# Altium schematic symbol library Capacitor - Aluminium TH.SchLib: 4591 symbols (part 13 of 27) (continued)
## ESK108M025AH4AA (continued)
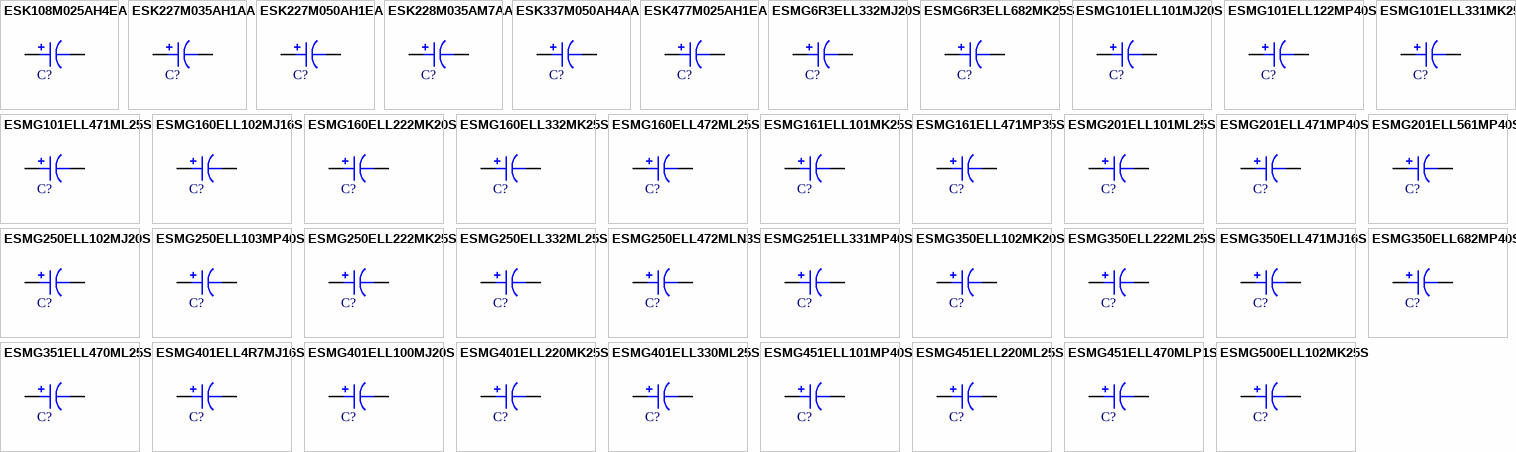
[diagram p54: symbols ESK108M025AH4EA to ESMG500ELL102MK25S]

## ESK108M025AH4EA
designator C?, comment 1000uF  (value not drawn)
CAP ALUM 1000UF 20% 25V RADIAL; Part Number: ESK108M025AH4EA; Manufacturer: KEMET; TemperatureRange: -40C ~ 85C; Type: Polar; Ripple Current: 760mA @ 120Hz; Value: 1000uF; PartId: 25450; Supplier 1: Digi-Key; Supplier Part Number 1: 399-6652-3-ND; ComponentLink1Description: Datasheet; ComponentLink1URL: http://www.kemet.com/docfinder?Partnumber=ESK108M025AH4EA; ComponentLink2Description: Digi-Key Listing; ComponentLink2URL: https://www.digikey.com/product-detail/en/kemet/ESK108M025AH4EA/399-6652-3-ND/3083067; Tolerance: 20%; Voltage: 25V; Price: 0.1466; Device Package: Radial, Can, 10mm
footprint CAP AL TH D10 L5 H22
pins: 1, 2

## ESK227M035AH1AA
designator C?, comment 220uF  (value not drawn)
CAP ALUM 220UF 20% 35V RADIAL; Part Number: ESK227M035AH1AA; Manufacturer: KEMET; TemperatureRange: -40C ~ 85C; Type: Polar; Ripple Current: 370mA @ 120Hz; Value: 220uF; PartId: 24678; Supplier 1: Digi-Key; Supplier Part Number 1: 399-6109-ND; ComponentLink1Description: Datasheet; ComponentLink1URL: http://capacitoredge.kemet.com/capedge2/DataSheet?pn=ESK227M035AH1AA; ComponentLink2Description: Digi-Key Listing; ComponentLink2URL: https://www.digikey.com/product-detail/en/kemet/ESK227M035AH1AA/399-6109-ND/2712538; Tolerance: 20%; Voltage: 35V; Price: 0.32; Device Package: Radial, Can, 10mm
footprint CAP AL TH D10 L5 H14.5
pins: 1, 2

## ESK227M050AH1EA
designator C?, comment 220uF  (value not drawn)
CAP ALUM 220UF 20% 50V RADIAL; Part Number: ESK227M050AH1EA; Manufacturer: KEMET; TemperatureRange: -40C ~ 85C; Type: Polar; Ripple Current: 360mA @ 120Hz; Value: 220uF; PartId: 24514; Supplier 1: Digi-Key; Supplier Part Number 1: 399-6654-3-ND; ComponentLink1Description: Datasheet; ComponentLink1URL: http://www.kemet.com/docfinder?Partnumber=ESK227M050AH1EA; ComponentLink2Description: Digi-Key Listing; ComponentLink2URL: https://www.digikey.com/product-detail/en/kemet/ESK227M050AH1EA/399-6654-3-ND/3083069; Tolerance: 20%; Voltage: 50V; Price: 0.1275; Device Package: Radial, Can, 10mm
footprint CAP AL TH D10 L5 H14.5
pins: 1, 2

## ESK228M035AM7AA
designator C?, comment 2200uF  (value not drawn)
CAP ALUM 2200UF 20% 35V RADIAL; Part Number: ESK228M035AM7AA; Manufacturer: KEMET; TemperatureRange: -40C ~ 85C; Type: Polar; Ripple Current: 1.6A @ 120Hz; Value: 2200uF; PartId: 26838; Supplier 1: Digi-Key; Supplier Part Number 1: 399-6111-ND; ComponentLink1Description: Datasheet; ComponentLink1URL: http://capacitoredge.kemet.com/capedge2/DataSheet?pn=ESK228M035AM7AA; ComponentLink2Description: Digi-Key Listing; ComponentLink2URL: https://www.digikey.com/product-detail/en/kemet/ESK228M035AM7AA/399-6111-ND/2712541; Tolerance: 20%; Voltage: 35V; Price: 0.99; Device Package: Radial, Can, 16mm
footprint CAP AL TH D16 L7.5 H27
pins: 1, 2

## ESK337M050AH4AA
designator C?, comment 330uF  (value not drawn)
CAP ALUM 330UF 20% 50V RADIAL; Part Number: ESK337M050AH4AA; Manufacturer: KEMET; TemperatureRange: -40C ~ 85C; Type: Polar; Ripple Current: 580mA @ 120Hz; Value: 330uF; PartId: 25498; Supplier 1: Digi-Key; Supplier Part Number 1: 399-6608-ND; ComponentLink1Description: Datasheet; ComponentLink1URL: http://www.kemet.com/docfinder?Partnumber=ESK337M050AH4AA; ComponentLink2Description: Digi-Key Listing; ComponentLink2URL: https://www.digikey.com/product-detail/en/kemet/ESK337M050AH4AA/399-6608-ND/3083023; Tolerance: 20%; Voltage: 50V; Price: 0.46; Device Package: Radial, Can, 10mm
footprint CAP AL TH D10 L5 H22
pins: 1, 2

## ESK477M025AH1EA
designator C?, comment 470uF  (value not drawn)
CAP ALUM 470UF 20% 25V RADIAL; Part Number: ESK477M025AH1EA; Manufacturer: KEMET; TemperatureRange: -40C ~ 85C; Type: Polar; Ripple Current: 460mA @ 120Hz; Value: 470uF; PartId: 24495; Supplier 1: Digi-Key; Supplier Part Number 1: 399-6656-3-ND; ComponentLink1Description: Datasheet; ComponentLink1URL: http://www.kemet.com/docfinder?Partnumber=ESK477M025AH1EA; ComponentLink2Description: Digi-Key Listing; ComponentLink2URL: https://www.digikey.com/product-detail/en/kemet/ESK477M025AH1EA/399-6656-3-ND/3083071; Tolerance: 20%; Voltage: 25V; Price: 0.1068; Device Package: Radial, Can, 10mm
footprint CAP AL TH D10 L5 H14.5
pins: 1, 2

## ESMG6R3ELL332MJ20S
designator C?, comment 3300uF  (value not drawn)
CAP ALUM 3300UF 20% 6.3V RADIAL; Part Number: ESMG6R3ELL332MJ20S; Manufacturer: United Chemi-Con; TemperatureRange: -40C ~ 85C; Type: Polar; Ripple Current: 1.185A @ 120Hz; Value: 3300uF; PartId: 25639; Supplier 1: Digi-Key; Supplier Part Number 1: 565-1007-ND; ComponentLink1Description: Datasheet; ComponentLink1URL: http://www.chemi-con.com/upload/files/6/3/873997624d9b1bc8060f8.pdf; ComponentLink2Description: Digi-Key Listing; ComponentLink2URL: https://www.digikey.com/product-detail/en/united-chemi-con/ESMG6R3ELL332MJ20S/565-1007-ND/755523; Tolerance: 20%; Voltage: 6.3V; Price: 0.73; Device Package: Radial, Can, 10mm
footprint CAP AL TH D10 L5 H22
pins: 1, 2

## ESMG6R3ELL682MK25S
designator C?, comment 6800uF  (value not drawn)
CAP ALUM 6800UF 20% 6.3V RADIAL; Part Number: ESMG6R3ELL682MK25S; Manufacturer: United Chemi-Con; TemperatureRange: -40C ~ 85C; Type: Polar; Ripple Current: 1.915A @ 120Hz; Value: 6800uF; PartId: 23709; Supplier 1: Digi-Key; Supplier Part Number 1: 565-1009-ND; ComponentLink1Description: Datasheet; ComponentLink1URL: http://www.chemi-con.com/upload/files/6/3/873997624d9b1bc8060f8.pdf; ComponentLink2Description: Digi-Key Listing; ComponentLink2URL: https://www.digikey.com/product-detail/en/united-chemi-con/ESMG6R3ELL682MK25S/565-1009-ND/755525; Tolerance: 20%; Voltage: 6.3V; Price: 1.16; Device Package: Radial, Can, 12.5mm
footprint CAP AL TH D12.5 L5 H26.5
pins: 1, 2

## ESMG101ELL101MJ20S
designator C?, comment 100uF  (value not drawn)
CAP ALUM 100UF 20% 100V RADIAL; Part Number: ESMG101ELL101MJ20S; Manufacturer: United Chemi-Con; TemperatureRange: -40C ~ 85C; Type: Polar; Ripple Current: 370mA @ 120Hz; Value: 100uF; PartId: 25629; Supplier 1: Digi-Key; Supplier Part Number 1: 565-1152-ND; ComponentLink1Description: Datasheet; ComponentLink1URL: http://www.chemi-con.com/upload/files/6/3/873997624d9b1bc8060f8.pdf; ComponentLink2Description: Digi-Key Listing; ComponentLink2URL: https://www.digikey.com/product-detail/en/united-chemi-con/ESMG101ELL101MJ20S/565-1152-ND/755668; Tolerance: 20%; Voltage: 100V; Price: 0.72; Device Package: Radial, Can, 10mm
footprint CAP AL TH D10 L5 H22
pins: 1, 2

## ESMG101ELL122MP40S
designator C?, comment 1200uF  (value not drawn)
CAP ALUM 1200UF 20% 100V RADIAL; Part Number: ESMG101ELL122MP40S; Manufacturer: United Chemi-Con; TemperatureRange: -40C ~ 85C; Type: Polar; Ripple Current: 1.98A @ 120Hz; Value: 1200uF; PartId: 27592; Supplier 1: Digi-Key; Supplier Part Number 1: 565-1161-ND; ComponentLink1Description: Datasheet; ComponentLink1URL: http://www.chemi-con.com/upload/files/6/3/873997624d9b1bc8060f8.pdf; ComponentLink2Description: Digi-Key Listing; ComponentLink2URL: https://www.digikey.com/product-detail/en/united-chemi-con/ESMG101ELL122MP40S/565-1161-ND/755677; Tolerance: 20%; Voltage: 100V; Price: 4.53; Device Package: Radial, Can, 22mm
footprint CAP AL TH D22 L10 H43
pins: 1, 2

## ESMG101ELL331MK25S
designator C?, comment 330uF  (value not drawn)
CAP ALUM 330UF 20% 100V RADIAL; Part Number: ESMG101ELL331MK25S; Manufacturer: United Chemi-Con; TemperatureRange: -40C ~ 85C; Type: Polar; Ripple Current: 760mA @ 120Hz; Value: 330uF; PartId: 23721; Supplier 1: Digi-Key; Supplier Part Number 1: 565-1154-ND; ComponentLink1Description: Datasheet; ComponentLink1URL: http://www.chemi-con.com/upload/files/6/3/873997624d9b1bc8060f8.pdf; ComponentLink2Description: Digi-Key Listing; ComponentLink2URL: https://www.digikey.com/product-detail/en/united-chemi-con/ESMG101ELL331MK25S/565-1154-ND/755670; Tolerance: 20%; Voltage: 100V; Price: 1.3; Device Package: Radial, Can, 12.5mm
footprint CAP AL TH D12.5 L5 H26.5
pins: 1, 2

## ESMG101ELL471ML25S
designator C?, comment 470uF  (value not drawn)
CAP ALUM 470UF 20% 100V RADIAL; Part Number: ESMG101ELL471ML25S; Manufacturer: United Chemi-Con; TemperatureRange: -40C ~ 85C; Type: Polar; Ripple Current: 1A @ 120Hz; Value: 470uF; PartId: 26691; Supplier 1: Digi-Key; Supplier Part Number 1: 565-1156-ND; ComponentLink1Description: Datasheet; ComponentLink1URL: http://www.chemi-con.com/upload/files/6/3/873997624d9b1bc8060f8.pdf; ComponentLink2Description: Digi-Key Listing; ComponentLink2URL: https://www.digikey.com/product-detail/en/united-chemi-con/ESMG101ELL471ML25S/565-1156-ND/755672; Tolerance: 20%; Voltage: 100V; Price: 1.84; Device Package: Radial, Can, 16mm
footprint CAP AL TH D16 L7.5 H26.5
pins: 1, 2

## ESMG160ELL102MJ16S
designator C?, comment 1000uF  (value not drawn)
CAP ALUM 1000UF 20% 16V RADIAL; Part Number: ESMG160ELL102MJ16S; Manufacturer: United Chemi-Con; TemperatureRange: -40C ~ 85C; Type: Polar; Ripple Current: 785mA @ 120Hz; Value: 1000uF; PartId: 25303; Supplier 1: Digi-Key; Supplier Part Number 1: 565-1041-ND; ComponentLink1Description: Datasheet; ComponentLink1URL: http://www.chemi-con.com/upload/files/6/3/873997624d9b1bc8060f8.pdf; ComponentLink2Description: Digi-Key Listing; ComponentLink2URL: https://www.digikey.com/product-detail/en/united-chemi-con/ESMG160ELL102MJ16S/565-1041-ND/755557; Tolerance: 20%; Voltage: 16V; Price: 0.64; Device Package: Radial, Can, 10mm
footprint CAP AL TH D10 L5 H17.5
pins: 1, 2

## ESMG160ELL222MK20S
designator C?, comment 2200uF  (value not drawn)
CAP ALUM 2200UF 20% 16V RADIAL; Part Number: ESMG160ELL222MK20S; Manufacturer: United Chemi-Con; TemperatureRange: -40C ~ 85C; Type: Polar; Ripple Current: 1.295A @ 120Hz; Value: 2200uF; PartId: 23019; Supplier 1: Digi-Key; Supplier Part Number 1: 565-1042-ND; ComponentLink1Description: Datasheet; ComponentLink1URL: http://www.chemi-con.com/upload/files/6/3/873997624d9b1bc8060f8.pdf; ComponentLink2Description: Digi-Key Listing; ComponentLink2URL: https://www.digikey.com/product-detail/en/united-chemi-con/ESMG160ELL222MK20S/565-1042-ND/755558; Tolerance: 20%; Voltage: 16V; Price: 0; Device Package: Radial, Can, 12.5mm
footprint CAP AL TH D12.5 L5 H21.5
pins: 1, 2

## ESMG160ELL332MK25S
designator C?, comment 3300uF  (value not drawn)
CAP ALUM 3300UF 20% 16V RADIAL; Part Number: ESMG160ELL332MK25S; Manufacturer: United Chemi-Con; TemperatureRange: -40C ~ 85C; Type: Polar; Ripple Current: 1.655A @ 120Hz; Value: 3300uF; PartId: 23705; Supplier 1: Digi-Key; Supplier Part Number 1: 565-1043-ND; ComponentLink1Description: Datasheet; ComponentLink1URL: http://www.chemi-con.com/upload/files/6/3/873997624d9b1bc8060f8.pdf; ComponentLink2Description: Digi-Key Listing; ComponentLink2URL: https://www.digikey.com/product-detail/en/united-chemi-con/ESMG160ELL332MK25S/565-1043-ND/755559; Tolerance: 20%; Voltage: 16V; Price: 1.14; Device Package: Radial, Can, 12.5mm
footprint CAP AL TH D12.5 L5 H26.5
pins: 1, 2

## ESMG160ELL472ML25S
designator C?, comment 4700uF  (value not drawn)
CAP ALUM 4700UF 20% 16V RADIAL; Part Number: ESMG160ELL472ML25S; Manufacturer: United Chemi-Con; TemperatureRange: -40C ~ 85C; Type: Polar; Ripple Current: 2.09A @ 120Hz; Value: 4700uF; PartId: 26664; Supplier 1: Digi-Key; Supplier Part Number 1: 565-1044-ND; ComponentLink1Description: Datasheet; ComponentLink1URL: http://www.chemi-con.com/upload/files/6/3/873997624d9b1bc8060f8.pdf; ComponentLink2Description: Digi-Key Listing; ComponentLink2URL: https://www.digikey.com/product-detail/en/united-chemi-con/ESMG160ELL472ML25S/565-1044-ND/755560; Tolerance: 20%; Voltage: 16V; Price: 1.63; Device Package: Radial, Can, 16mm
footprint CAP AL TH D16 L7.5 H26.5
pins: 1, 2

## ESMG161ELL101MK25S
designator C?, comment 100uF  (value not drawn)
CAP ALUM 100UF 20% 160V RADIAL; Part Number: ESMG161ELL101MK25S; Manufacturer: United Chemi-Con; TemperatureRange: -40C ~ 85C; Type: Polar; Ripple Current: 430mA @ 120Hz; Value: 100uF; PartId: 23738; Supplier 1: Digi-Key; Supplier Part Number 1: 565-1169-ND; ComponentLink1Description: Datasheet; ComponentLink1URL: http://www.chemi-con.com/upload/files/6/3/873997624d9b1bc8060f8.pdf; ComponentLink2Description: Digi-Key Listing; ComponentLink2URL: https://www.digikey.com/product-detail/en/united-chemi-con/ESMG161ELL101MK25S/565-1169-ND/755685; Tolerance: 20%; Voltage: 160V; Price: 1.54; Device Package: Radial, Can, 12.5mm
footprint CAP AL TH D12.5 L5 H26.5
pins: 1, 2

## ESMG161ELL471MP35S
designator C?, comment 470uF  (value not drawn)
CAP ALUM 470UF 20% 160V RADIAL; Part Number: ESMG161ELL471MP35S; Manufacturer: United Chemi-Con; TemperatureRange: -40C ~ 85C; Type: Polar; Ripple Current: 1.34A @ 120Hz; Value: 470uF; PartId: 27604; Supplier 1: Digi-Key; Supplier Part Number 1: 565-1176-ND; ComponentLink1Description: Datasheet; ComponentLink1URL: http://www.chemi-con.com/upload/files/6/3/873997624d9b1bc8060f8.pdf; ComponentLink2Description: Digi-Key Listing; ComponentLink2URL: https://www.digikey.com/product-detail/en/united-chemi-con/ESMG161ELL471MP35S/565-1176-ND/755692; Tolerance: 20%; Voltage: 160V; Price: 4.85; Device Package: Radial, Can, 22mm
footprint CAP AL TH D22 L10 H43
pins: 1, 2

## ESMG201ELL101ML25S
designator C?, comment 100uF  (value not drawn)
CAP ALUM 100UF 20% 200V RADIAL; Part Number: ESMG201ELL101ML25S; Manufacturer: United Chemi-Con; TemperatureRange: -40C ~ 85C; Type: Polar; Ripple Current: 475mA @ 120Hz; Value: 100uF; PartId: 26702; Supplier 1: Digi-Key; Supplier Part Number 1: 565-1185-ND; ComponentLink1Description: Datasheet; ComponentLink1URL: http://www.chemi-con.com/upload/files/6/3/873997624d9b1bc8060f8.pdf; ComponentLink2Description: Digi-Key Listing; ComponentLink2URL: https://www.digikey.com/product-detail/en/united-chemi-con/ESMG201ELL101ML25S/565-1185-ND/755701; Tolerance: 20%; Voltage: 200V; Price: 2.01; Device Package: Radial, Can, 16mm
footprint CAP AL TH D16 L7.5 H26.5
pins: 1, 2

## ESMG201ELL471MP40S
designator C?, comment 470uF  (value not drawn)
CAP ALUM 470UF 20% 200V RADIAL; Part Number: ESMG201ELL471MP40S; Manufacturer: United Chemi-Con; TemperatureRange: -40C ~ 85C; Type: Polar; Ripple Current: 1.35A @ 120Hz; Value: 470uF; PartId: 27585; Supplier 1: Digi-Key; Supplier Part Number 1: 565-1195-ND; ComponentLink1Description: Datasheet; ComponentLink1URL: http://www.chemi-con.com/upload/files/6/3/873997624d9b1bc8060f8.pdf; ComponentLink2Description: Digi-Key Listing; ComponentLink2URL: https://www.digikey.com/product-detail/en/united-chemi-con/ESMG201ELL471MP40S/565-1195-ND/755711; Tolerance: 20%; Voltage: 200V; Price: 4.93; Device Package: Radial, Can, 22mm
footprint CAP AL TH D22 L10 H43
pins: 1, 2

## ESMG201ELL561MP40S
designator C?, comment 560uF  (value not drawn)
CAP ALUM 560UF 20% 200V RADIAL; Part Number: ESMG201ELL561MP40S; Manufacturer: United Chemi-Con; TemperatureRange: -40C ~ 85C; Type: Polar; Ripple Current: 1.43A @ 120Hz; Value: 560uF; PartId: 27586; Supplier 1: Digi-Key; Supplier Part Number 1: 565-1196-ND; ComponentLink1Description: Datasheet; ComponentLink1URL: http://www.chemi-con.com/upload/files/6/3/873997624d9b1bc8060f8.pdf; ComponentLink2Description: Digi-Key Listing; ComponentLink2URL: https://www.digikey.com/product-detail/en/united-chemi-con/ESMG201ELL561MP40S/565-1196-ND/755712; Tolerance: 20%; Voltage: 200V; Price: 5.45; Device Package: Radial, Can, 22mm
footprint CAP AL TH D22 L10 H43
pins: 1, 2

## ESMG250ELL102MJ20S
designator C?, comment 1000uF  (value not drawn)
CAP ALUM 1000UF 20% 25V RADIAL; Part Number: ESMG250ELL102MJ20S; Manufacturer: United Chemi-Con; TemperatureRange: -40C ~ 85C; Type: Polar; Ripple Current: 955mA @ 120Hz; Value: 1000uF; PartId: 25638; Supplier 1: Digi-Key; Supplier Part Number 1: 565-1063-ND; ComponentLink1Description: Datasheet; ComponentLink1URL: http://www.chemi-con.com/upload/files/6/3/873997624d9b1bc8060f8.pdf; ComponentLink2Description: Digi-Key Listing; ComponentLink2URL: https://www.digikey.com/product-detail/en/united-chemi-con/ESMG250ELL102MJ20S/565-1063-ND/755579; Tolerance: 20%; Voltage: 25V; Price: 0.73; Device Package: Radial, Can, 10mm
footprint CAP AL TH D10 L5 H22
pins: 1, 2

## ESMG250ELL103MP40S
designator C?, comment 10000uF  (value not drawn)
CAP ALUM 10000UF 20% 25V RADIAL; Part Number: ESMG250ELL103MP40S; Manufacturer: United Chemi-Con; TemperatureRange: -40C ~ 85C; Type: Polar; Ripple Current: 3.24A @ 120Hz; Value: 10000uF; PartId: 27579; Supplier 1: Digi-Key; Supplier Part Number 1: 565-1074-ND; ComponentLink1Description: Datasheet; ComponentLink1URL: http://www.chemi-con.com/upload/files/6/3/873997624d9b1bc8060f8.pdf; ComponentLink2Description: Digi-Key Listing; ComponentLink2URL: https://www.digikey.com/product-detail/en/united-chemi-con/ESMG250ELL103MP40S/565-1074-ND/755590; Tolerance: 20%; Voltage: 25V; Price: 4.53; Device Package: Radial, Can, 22mm
footprint CAP AL TH D22 L10 H43
pins: 1, 2

## ESMG250ELL222MK25S
designator C?, comment 2200uF  (value not drawn)
CAP ALUM 2200UF 20% 25V RADIAL; Part Number: ESMG250ELL222MK25S; Manufacturer: United Chemi-Con; TemperatureRange: -40C ~ 85C; Type: Polar; Ripple Current: 1.54A @ 120Hz; Value: 2200uF; PartId: 23707; Supplier 1: Digi-Key; Supplier Part Number 1: 565-1064-ND; ComponentLink1Description: Datasheet; ComponentLink1URL: http://www.chemi-con.com/upload/files/6/3/873997624d9b1bc8060f8.pdf; ComponentLink2Description: Digi-Key Listing; ComponentLink2URL: https://www.digikey.com/product-detail/en/united-chemi-con/ESMG250ELL222MK25S/565-1064-ND/755580; Tolerance: 20%; Voltage: 25V; Price: 1.15; Device Package: Radial, Can, 12.5mm
footprint CAP AL TH D12.5 L5 H26.5
pins: 1, 2

## ESMG250ELL332ML25S
designator C?, comment 3300uF  (value not drawn)
CAP ALUM 3300UF 20% 25V RADIAL; Part Number: ESMG250ELL332ML25S; Manufacturer: United Chemi-Con; TemperatureRange: -40C ~ 85C; Type: Polar; Ripple Current: 1.975A @ 120Hz; Value: 3300uF; PartId: 26684; Supplier 1: Digi-Key; Supplier Part Number 1: 565-1065-ND; ComponentLink1Description: Datasheet; ComponentLink1URL: http://www.chemi-con.com/upload/files/6/3/873997624d9b1bc8060f8.pdf; ComponentLink2Description: Digi-Key Listing; ComponentLink2URL: https://www.digikey.com/product-detail/en/united-chemi-con/ESMG250ELL332ML25S/565-1065-ND/755581; Tolerance: 20%; Voltage: 25V; Price: 1.81; Device Package: Radial, Can, 16mm
footprint CAP AL TH D16 L7.5 H26.5
pins: 1, 2

## ESMG250ELL472MLN3S
designator C?, comment 4700uF  (value not drawn)
CAP ALUM 4700UF 20% 25V RADIAL; Part Number: ESMG250ELL472MLN3S; Manufacturer: United Chemi-Con; TemperatureRange: -40C ~ 85C; Type: Polar; Ripple Current: 2.42A @ 120Hz; Value: 4700uF; PartId: 27179; Supplier 1: Digi-Key; Supplier Part Number 1: 565-1067-ND; ComponentLink1Description: Datasheet; ComponentLink1URL: http://www.chemi-con.com/upload/files/6/3/873997624d9b1bc8060f8.pdf; ComponentLink2Description: Digi-Key Listing; ComponentLink2URL: https://www.digikey.com/product-detail/en/united-chemi-con/ESMG250ELL472MLN3S/565-1067-ND/755583; Tolerance: 20%; Voltage: 25V; Price: 1.95; Device Package: Radial, Can, 16mm
footprint CAP AL TH D16 L7.5 H33.5
pins: 1, 2

## ESMG251ELL331MP40S
designator C?, comment 330uF  (value not drawn)
CAP ALUM 330UF 20% 250V RADIAL; Part Number: ESMG251ELL331MP40S; Manufacturer: United Chemi-Con; TemperatureRange: -40C ~ 85C; Type: Polar; Ripple Current: 1.06A @ 120Hz; Value: 330uF; PartId: 27582; Supplier 1: Digi-Key; Supplier Part Number 1: 565-1214-ND; ComponentLink1Description: Datasheet; ComponentLink1URL: http://www.chemi-con.com/upload/files/6/3/873997624d9b1bc8060f8.pdf; ComponentLink2Description: Digi-Key Listing; ComponentLink2URL: https://www.digikey.com/product-detail/en/united-chemi-con/ESMG251ELL331MP40S/565-1214-ND/755730; Tolerance: 20%; Voltage: 250V; Price: 5.1; Device Package: Radial, Can, 22mm
footprint CAP AL TH D22 L10 H43
pins: 1, 2

## ESMG350ELL102MK20S
designator C?, comment 1000uF  (value not drawn)
CAP ALUM 1000UF 20% 35V RADIAL; Part Number: ESMG350ELL102MK20S; Manufacturer: United Chemi-Con; TemperatureRange: -40C ~ 85C; Type: Polar; Ripple Current: 1.145A @ 120Hz; Value: 1000uF; PartId: 23012; Supplier 1: Digi-Key; Supplier Part Number 1: 565-1086-ND; ComponentLink1Description: Datasheet; ComponentLink1URL: http://www.chemi-con.com/upload/files/6/3/873997624d9b1bc8060f8.pdf; ComponentLink2Description: Digi-Key Listing; ComponentLink2URL: https://www.digikey.com/product-detail/en/united-chemi-con/ESMG350ELL102MK20S/565-1086-ND/755602; Tolerance: 20%; Voltage: 35V; Price: 0; Device Package: Radial, Can, 12.5mm
footprint CAP AL TH D12.5 L5 H21.5
pins: 1, 2

## ESMG350ELL222ML25S
designator C?, comment 2200uF  (value not drawn)
CAP ALUM 2200UF 20% 35V RADIAL; Part Number: ESMG350ELL222ML25S; Manufacturer: United Chemi-Con; TemperatureRange: -40C ~ 85C; Type: Polar; Ripple Current: 1.785A @ 120Hz; Value: 2200uF; PartId: 26675; Supplier 1: Digi-Key; Supplier Part Number 1: 565-1087-ND; ComponentLink1Description: Datasheet; ComponentLink1URL: http://www.chemi-con.com/upload/files/6/3/873997624d9b1bc8060f8.pdf; ComponentLink2Description: Digi-Key Listing; ComponentLink2URL: https://www.digikey.com/product-detail/en/united-chemi-con/ESMG350ELL222ML25S/565-1087-ND/755603; Tolerance: 20%; Voltage: 35V; Price: 1.78; Device Package: Radial, Can, 16mm
footprint CAP AL TH D16 L7.5 H26.5
pins: 1, 2

## ESMG350ELL471MJ16S
designator C?, comment 470uF  (value not drawn)
CAP ALUM 470UF 20% 35V RADIAL; Part Number: ESMG350ELL471MJ16S; Manufacturer: United Chemi-Con; TemperatureRange: -40C ~ 85C; Type: Polar; Ripple Current: 645mA @ 120Hz; Value: 470uF; PartId: 25320; Supplier 1: Digi-Key; Supplier Part Number 1: 565-1085-ND; ComponentLink1Description: Datasheet; ComponentLink1URL: http://www.chemi-con.com/upload/files/6/3/873997624d9b1bc8060f8.pdf; ComponentLink2Description: Digi-Key Listing; ComponentLink2URL: https://www.digikey.com/product-detail/en/united-chemi-con/ESMG350ELL471MJ16S/565-1085-ND/755601; Tolerance: 20%; Voltage: 35V; Price: 0.66; Device Package: Radial, Can, 10mm
footprint CAP AL TH D10 L5 H17.5
pins: 1, 2

## ESMG350ELL682MP40S
designator C?, comment 6800uF  (value not drawn)
CAP ALUM 6800UF 20% 35V RADIAL; Part Number: ESMG350ELL682MP40S; Manufacturer: United Chemi-Con; TemperatureRange: -40C ~ 85C; Type: Polar; Ripple Current: 3.09A @ 120Hz; Value: 6800uF; PartId: 27593; Supplier 1: Digi-Key; Supplier Part Number 1: 565-1096-ND; ComponentLink1Description: Datasheet; ComponentLink1URL: http://www.chemi-con.com/upload/files/6/3/873997624d9b1bc8060f8.pdf; ComponentLink2Description: Digi-Key Listing; ComponentLink2URL: https://www.digikey.com/product-detail/en/united-chemi-con/ESMG350ELL682MP40S/565-1096-ND/755612; Tolerance: 20%; Voltage: 35V; Price: 4.65; Device Package: Radial, Can, 22mm
footprint CAP AL TH D22 L10 H43
pins: 1, 2

## ESMG351ELL470ML25S
designator C?, comment 47uF  (value not drawn)
CAP ALUM 47UF 20% 350V RADIAL; Part Number: ESMG351ELL470ML25S; Manufacturer: United Chemi-Con; TemperatureRange: -40C ~ 85C; Type: Polar; Ripple Current: 325mA @ 120Hz; Value: 47uF; PartId: 26705; Supplier 1: Digi-Key; Supplier Part Number 1: 565-1224-ND; ComponentLink1Description: Datasheet; ComponentLink1URL: http://www.chemi-con.com/upload/files/6/3/873997624d9b1bc8060f8.pdf; ComponentLink2Description: Digi-Key Listing; ComponentLink2URL: https://www.digikey.com/product-detail/en/united-chemi-con/ESMG351ELL470ML25S/565-1224-ND/755740; Tolerance: 20%; Voltage: 350V; Price: 2.22; Device Package: Radial, Can, 16mm
footprint CAP AL TH D16 L7.5 H26.5
pins: 1, 2

## ESMG401ELL4R7MJ16S
designator C?, comment 4.7uF  (value not drawn)
CAP ALUM 4.7UF 20% 400V RADIAL; Part Number: ESMG401ELL4R7MJ16S; Manufacturer: United Chemi-Con; TemperatureRange: -40C ~ 85C; Type: Polar; Ripple Current: 71mA @ 120Hz; Value: 4.7uF; PartId: 25412; Supplier 1: Digi-Key; Supplier Part Number 1: 565-1230-ND; ComponentLink1Description: Datasheet; ComponentLink1URL: http://www.chemi-con.com/upload/files/6/3/873997624d9b1bc8060f8.pdf; ComponentLink2Description: Digi-Key Listing; ComponentLink2URL: https://www.digikey.com/product-detail/en/united-chemi-con/ESMG401ELL4R7MJ16S/565-1230-ND/755746; Tolerance: 20%; Voltage: 400V; Price: 0.84; Device Package: Radial, Can, 10mm
footprint CAP AL TH D10 L5 H17.5
pins: 1, 2

## ESMG401ELL100MJ20S
designator C?, comment 10uF  (value not drawn)
CAP ALUM 10UF 20% 400V RADIAL; Part Number: ESMG401ELL100MJ20S; Manufacturer: United Chemi-Con; TemperatureRange: -40C ~ 85C; Type: Polar; Ripple Current: 115mA @ 120Hz; Value: 10uF; PartId: 25703; Supplier 1: Digi-Key; Supplier Part Number 1: 565-1231-ND; ComponentLink1Description: Datasheet; ComponentLink1URL: http://www.chemi-con.com/upload/files/6/3/873997624d9b1bc8060f8.pdf; ComponentLink2Description: Digi-Key Listing; ComponentLink2URL: https://www.digikey.com/product-detail/en/united-chemi-con/ESMG401ELL100MJ20S/565-1231-ND/755747; Tolerance: 20%; Voltage: 400V; Price: 0.9; Device Package: Radial, Can, 10mm
footprint CAP AL TH D10 L5 H22
pins: 1, 2

## ESMG401ELL220MK25S
designator C?, comment 22uF  (value not drawn)
CAP ALUM 22UF 20% 400V RADIAL; Part Number: ESMG401ELL220MK25S; Manufacturer: United Chemi-Con; TemperatureRange: -40C ~ 85C; Type: Polar; Ripple Current: 205mA @ 120Hz; Value: 22uF; PartId: 23732; Supplier 1: Digi-Key; Supplier Part Number 1: 565-1232-ND; ComponentLink1Description: Datasheet; ComponentLink1URL: http://www.chemi-con.com/upload/files/6/3/873997624d9b1bc8060f8.pdf; ComponentLink2Description: Digi-Key Listing; ComponentLink2URL: https://www.digikey.com/product-detail/en/united-chemi-con/ESMG401ELL220MK25S/565-1232-ND/755748; Tolerance: 20%; Voltage: 400V; Price: 1.46; Device Package: Radial, Can, 12.5mm
footprint CAP AL TH D12.5 L5 H26.5
pins: 1, 2

## ESMG401ELL330ML25S
designator C?, comment 33uF  (value not drawn)
CAP ALUM 33UF 20% 400V RADIAL; Part Number: ESMG401ELL330ML25S; Manufacturer: United Chemi-Con; TemperatureRange: -40C ~ 85C; Type: Polar; Ripple Current: 275mA @ 120Hz; Value: 33uF; PartId: 26694; Supplier 1: Digi-Key; Supplier Part Number 1: 565-1233-ND; ComponentLink1Description: Datasheet; ComponentLink1URL: http://www.chemi-con.com/upload/files/6/3/873997624d9b1bc8060f8.pdf; ComponentLink2Description: Digi-Key Listing; ComponentLink2URL: https://www.digikey.com/product-detail/en/united-chemi-con/ESMG401ELL330ML25S/565-1233-ND/755749; Tolerance: 20%; Voltage: 400V; Price: 1.85; Device Package: Radial, Can, 16mm
footprint CAP AL TH D16 L7.5 H26.5
pins: 1, 2

## ESMG451ELL101MP40S
designator C?, comment 100uF  (value not drawn)
CAP ALUM 100UF 20% 450V RADIAL; Part Number: ESMG451ELL101MP40S; Manufacturer: United Chemi-Con; TemperatureRange: -25C ~ 85C; Type: Polar; Ripple Current: 470mA @ 120Hz; Value: 100uF; PartId: 27605; Supplier 1: Digi-Key; Supplier Part Number 1: 565-1260-ND; ComponentLink1Description: Datasheet; ComponentLink1URL: http://www.chemi-con.com/upload/files/6/3/873997624d9b1bc8060f8.pdf; ComponentLink2Description: Digi-Key Listing; ComponentLink2URL: https://www.digikey.com/product-detail/en/united-chemi-con/ESMG451ELL101MP40S/565-1260-ND/755776; Tolerance: 20%; Voltage: 450V; Price: 6.37; Device Package: Radial, Can, 22mm
footprint CAP AL TH D22 L10 H43
pins: 1, 2

## ESMG451ELL220ML25S
designator C?, comment 22uF  (value not drawn)
CAP ALUM 22UF 20% 450V RADIAL; Part Number: ESMG451ELL220ML25S; Manufacturer: United Chemi-Con; TemperatureRange: -25C ~ 85C; Type: Polar; Ripple Current: 165mA @ 120Hz; Value: 22uF; PartId: 26698; Supplier 1: Digi-Key; Supplier Part Number 1: 565-1249-ND; ComponentLink1Description: Datasheet; ComponentLink1URL: http://www.chemi-con.com/upload/files/6/3/873997624d9b1bc8060f8.pdf; ComponentLink2Description: Digi-Key Listing; ComponentLink2URL: https://www.digikey.com/product-detail/en/united-chemi-con/ESMG451ELL220ML25S/565-1249-ND/755765; Tolerance: 20%; Voltage: 450V; Price: 1.95; Device Package: Radial, Can, 16mm
footprint CAP AL TH D16 L7.5 H26.5
pins: 1, 2

## ESMG451ELL470MLP1S
designator C?, comment 47uF  (value not drawn)
CAP ALUM 47UF 20% 450V RADIAL; Part Number: ESMG451ELL470MLP1S; Manufacturer: United Chemi-Con; TemperatureRange: -25C ~ 85C; Type: Polar; Ripple Current: 265mA @ 120Hz; Value: 47uF; PartId: 27426; Supplier 1: Digi-Key; Supplier Part Number 1: 565-1253-ND; ComponentLink1Description: Datasheet; ComponentLink1URL: http://www.chemi-con.com/upload/files/6/3/873997624d9b1bc8060f8.pdf; ComponentLink2Description: Digi-Key Listing; ComponentLink2URL: https://www.digikey.com/product-detail/en/united-chemi-con/ESMG451ELL470MLP1S/565-1253-ND/755769; Tolerance: 20%; Voltage: 450V; Price: 2.82; Device Package: Radial, Can, 16mm
footprint CAP AL TH D16 L7.5 H37
pins: 1, 2

## ESMG500ELL102MK25S
designator C?, comment 1000uF  (value not drawn)
CAP ALUM 1000UF 20% 50V RADIAL; Part Number: ESMG500ELL102MK25S; Manufacturer: United Chemi-Con; TemperatureRange: -40C ~ 85C; Type: Polar; Ripple Current: 1.34A @ 120Hz; Value: 1000uF; PartId: 23720; Supplier 1: Digi-Key; Supplier Part Number 1: 565-1114-ND; ComponentLink1Description: Datasheet; ComponentLink1URL: http://www.chemi-con.com/upload/files/6/3/873997624d9b1bc8060f8.pdf; ComponentLink2Description: Digi-Key Listing; ComponentLink2URL: https://www.digikey.com/product-detail/en/united-chemi-con/ESMG500ELL102MK25S/565-1114-ND/755630; Tolerance: 20%; Voltage: 50V; Price: 1.26; Device Package: Radial, Can, 12.5mm
footprint CAP AL TH D12.5 L5 H26.5
pins: 1, 2

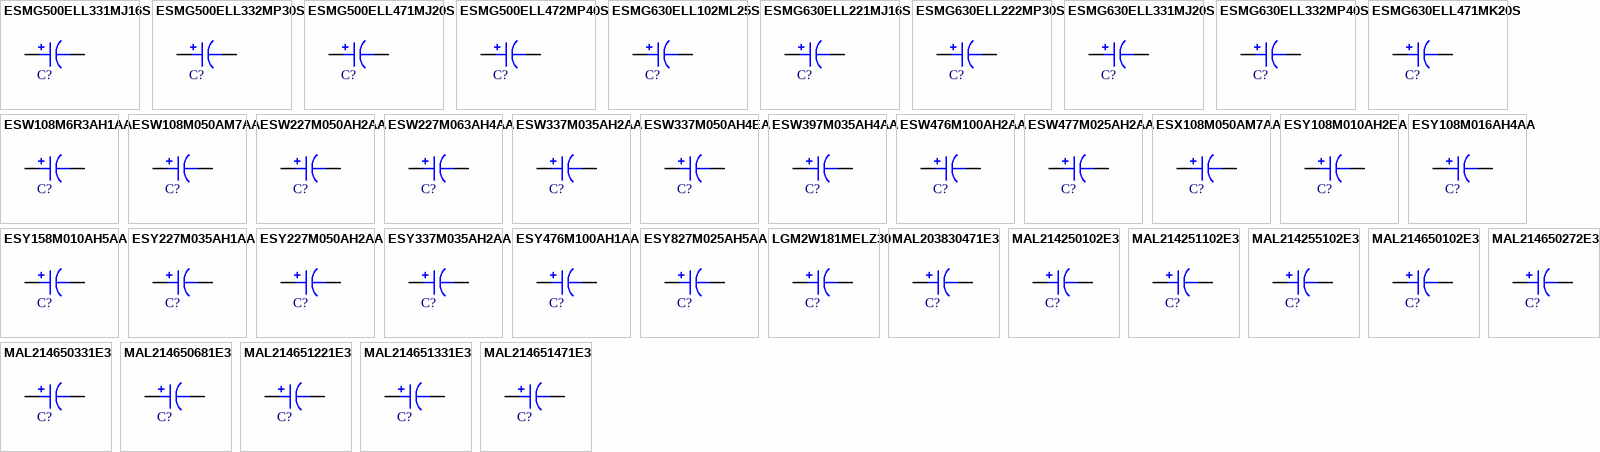
[diagram p55: symbols ESMG500ELL331MJ16S to MAL214651471E3]

## ESMG500ELL331MJ16S
designator C?, comment 330uF  (value not drawn)
CAP ALUM 330UF 20% 50V RADIAL; Part Number: ESMG500ELL331MJ16S; Manufacturer: United Chemi-Con; TemperatureRange: -40C ~ 85C; Type: Polar; Ripple Current: 585mA @ 120Hz; Value: 330uF; PartId: 25341; Supplier 1: Digi-Key; Supplier Part Number 1: 565-1112-ND; ComponentLink1Description: Datasheet; ComponentLink1URL: http://www.chemi-con.com/upload/files/6/3/873997624d9b1bc8060f8.pdf; ComponentLink2Description: Digi-Key Listing; ComponentLink2URL: https://www.digikey.com/product-detail/en/united-chemi-con/ESMG500ELL331MJ16S/565-1112-ND/755628; Tolerance: 20%; Voltage: 50V; Price: 0.67; Device Package: Radial, Can, 10mm
footprint CAP AL TH D10 L5 H17.5
pins: 1, 2

## ESMG500ELL332MP30S
designator C?, comment 3300uF  (value not drawn)
CAP ALUM 3300UF 20% 50V RADIAL; Part Number: ESMG500ELL332MP30S; Manufacturer: United Chemi-Con; TemperatureRange: -40C ~ 85C; Type: Polar; Ripple Current: 2.42A @ 120Hz; Value: 3300uF; PartId: 27565; Supplier 1: Digi-Key; Supplier Part Number 1: 565-1120-ND; ComponentLink1Description: Datasheet; ComponentLink1URL: http://www.chemi-con.com/upload/files/6/3/873997624d9b1bc8060f8.pdf; ComponentLink2Description: Digi-Key Listing; ComponentLink2URL: https://www.digikey.com/product-detail/en/united-chemi-con/ESMG500ELL332MP30S/565-1120-ND/755636; Tolerance: 20%; Voltage: 50V; Price: 4.05; Device Package: Radial, Can, 22mm
footprint CAP AL TH D22 L10 H33
pins: 1, 2

## ESMG500ELL471MJ20S
designator C?, comment 470uF  (value not drawn)
CAP ALUM 470UF 20% 50V RADIAL; Part Number: ESMG500ELL471MJ20S; Manufacturer: United Chemi-Con; TemperatureRange: -40C ~ 85C; Type: Polar; Ripple Current: 755mA @ 120Hz; Value: 470uF; PartId: 25670; Supplier 1: Digi-Key; Supplier Part Number 1: 565-1113-ND; ComponentLink1Description: Datasheet; ComponentLink1URL: http://www.chemi-con.com/upload/files/6/3/873997624d9b1bc8060f8.pdf; ComponentLink2Description: Digi-Key Listing; ComponentLink2URL: https://www.digikey.com/product-detail/en/united-chemi-con/ESMG500ELL471MJ20S/565-1113-ND/755629; Tolerance: 20%; Voltage: 50V; Price: 0.77; Device Package: Radial, Can, 10mm
footprint CAP AL TH D10 L5 H22
pins: 1, 2

## ESMG500ELL472MP40S
designator C?, comment 4700uF  (value not drawn)
CAP ALUM 4700UF 20% 50V RADIAL; Part Number: ESMG500ELL472MP40S; Manufacturer: United Chemi-Con; TemperatureRange: -40C ~ 85C; Type: Polar; Ripple Current: 2.96A @ 120Hz; Value: 4700uF; PartId: 27581; Supplier 1: Digi-Key; Supplier Part Number 1: 565-1122-ND; ComponentLink1Description: Datasheet; ComponentLink1URL: http://www.chemi-con.com/upload/files/6/3/873997624d9b1bc8060f8.pdf; ComponentLink2Description: Digi-Key Listing; ComponentLink2URL: https://www.digikey.com/product-detail/en/united-chemi-con/ESMG500ELL472MP40S/565-1122-ND/755638; Tolerance: 20%; Voltage: 50V; Price: 4.9; Device Package: Radial, Can, 22mm
footprint CAP AL TH D22 L10 H43
pins: 1, 2

## ESMG630ELL102ML25S
designator C?, comment 1000uF  (value not drawn)
CAP ALUM 1000UF 20% 63V RADIAL; Part Number: ESMG630ELL102ML25S; Manufacturer: United Chemi-Con; TemperatureRange: -40C ~ 85C; Type: Polar; Ripple Current: 1.3A @ 120Hz; Value: 1000uF; PartId: 26685; Supplier 1: Digi-Key; Supplier Part Number 1: 565-1133-ND; ComponentLink1Description: Datasheet; ComponentLink1URL: http://www.chemi-con.com/upload/files/6/3/873997624d9b1bc8060f8.pdf; ComponentLink2Description: Digi-Key Listing; ComponentLink2URL: https://www.digikey.com/product-detail/en/united-chemi-con/ESMG630ELL102ML25S/565-1133-ND/755649; Tolerance: 20%; Voltage: 63V; Price: 1.81; Device Package: Radial, Can, 16mm
footprint CAP AL TH D16 L7.5 H26.5
pins: 1, 2